# Altium footprint library 2.52-直插元件.PcbLib: 467 footprints (part 17 of 30)
Each footprint in its own frame and in the unit in brackets; x right, y up, seen from the top. Pads: shape width x height; smd on the part's side, far side on the other; paste and mask are expansions set on the pad; w line width, h text height; cw(c..) or ccw(c..) is an arc to the next point about the centre after c.
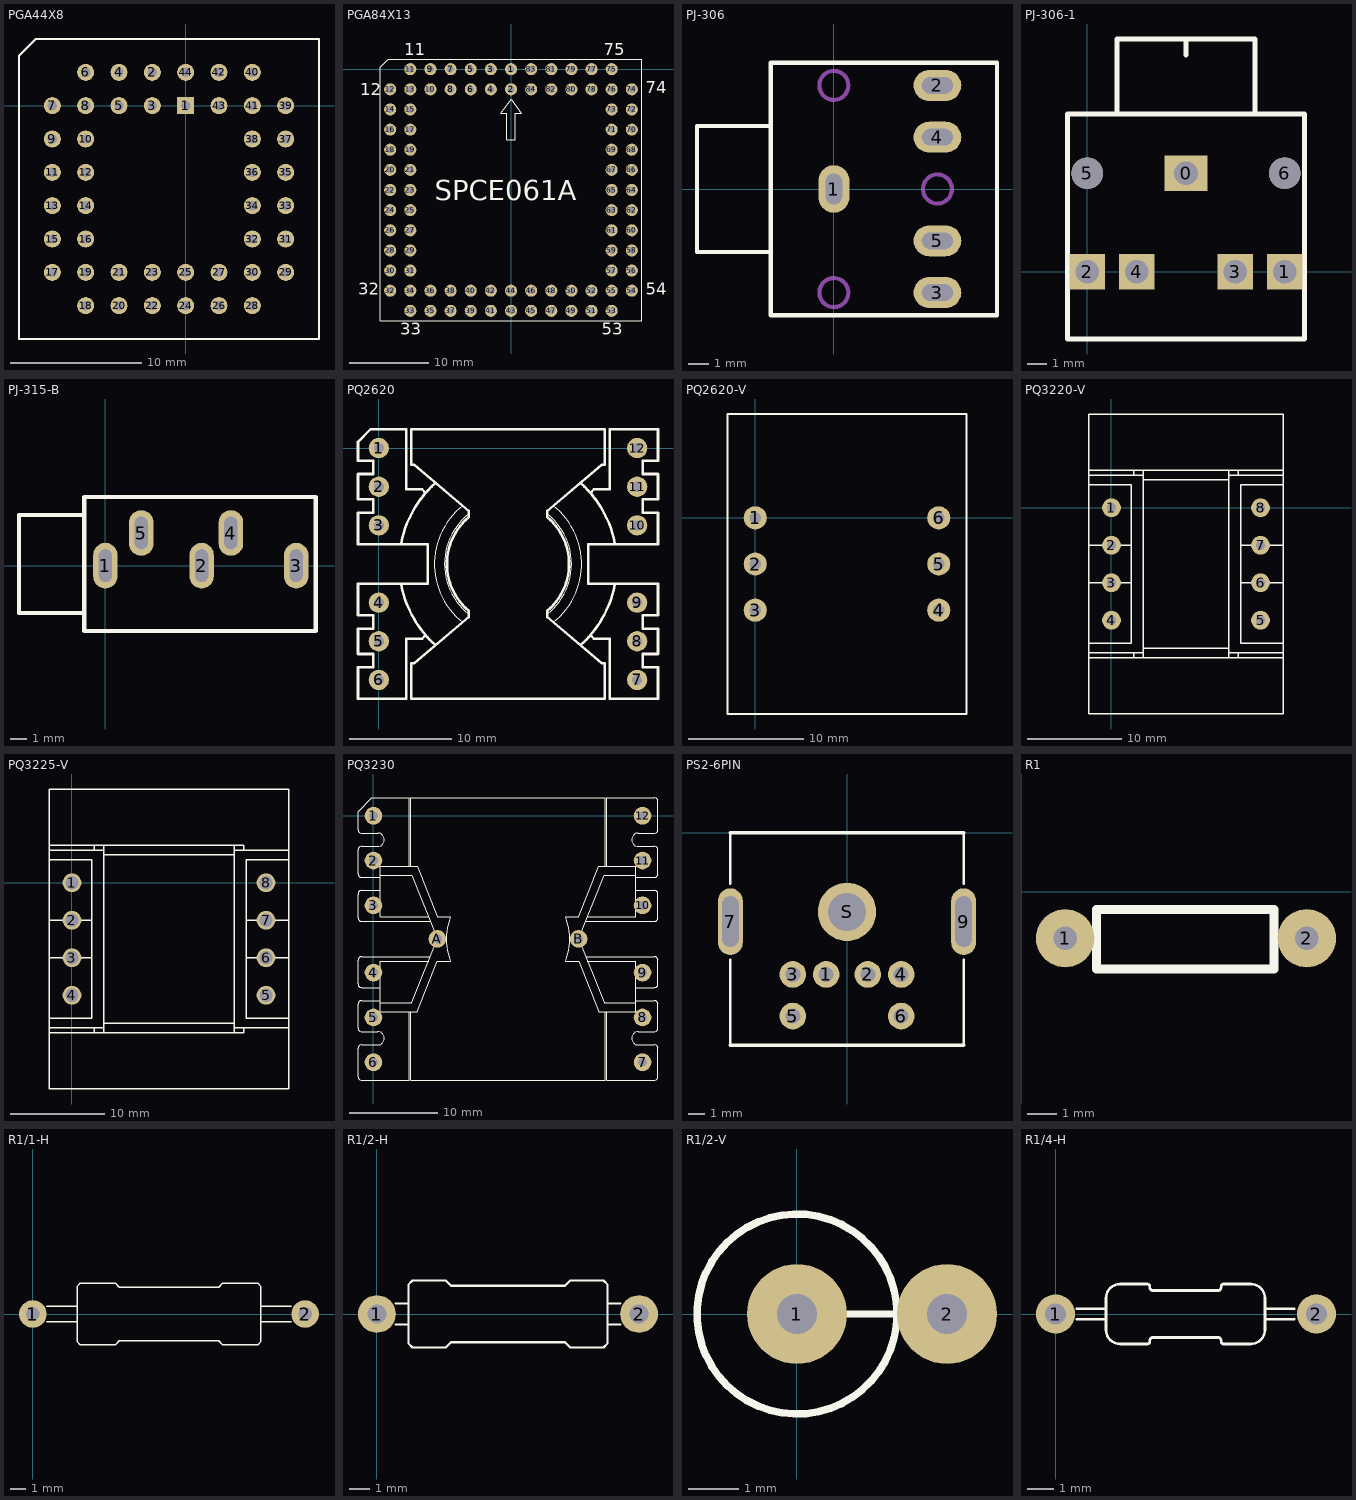
[diagram p16: the footprints below, top view; thin cyan lines are the x and y axes]

## PGA44X8 [mm]
pads (44):
  rect 1.3x1.3 hole 0.7: 1(0,0)
  round 1.3 hole 0.7: 2(-2.54,2.54) 3(-2.54,0) 4(-5.08,2.54) 5(-5.08,0) 6(-7.62,2.54) 7(-10.16,0) 8(-7.62,0) 9(-10.16,-2.54) 10(-7.62,-2.54) 11(-10.16,-5.08) 12(-7.62,-5.08) 13(-10.16,-7.62) 14(-7.62,-7.62) 15(-10.16,-10.16) 16(-7.62,-10.16) 17(-10.16,-12.7) 18(-7.62,-15.24) 19(-7.62,-12.7) 20(-5.08,-15.24) 21(-5.08,-12.7) 22(-2.54,-15.24) 23(-2.54,-12.7) 24(0,-15.24) 25(0,-12.7) 26(2.54,-15.24) 27(2.54,-12.7) 28(5.08,-15.24) 29(7.62,-12.7) 30(5.08,-12.7) 31(7.62,-10.16) 32(5.08,-10.16) 33(7.62,-7.62) 34(5.08,-7.62) 35(7.62,-5.08) 36(5.08,-5.08) 37(7.62,-2.54) 38(5.08,-2.54) 39(7.62,0) 40(5.08,2.54) 41(5.08,0) 42(2.54,2.54) 43(2.54,0) 44(0,2.54)
Top Overlay:
  lines w0.15: -12.7,-17.78 10.16,-17.78 10.16,5.08 -11.43,5.08 -12.7,3.81 -12.7,-17.78
3D body "User Library-PLCC44-1.STEP": height 8.16, standoff -3.3, extent -12.495,-17.575 9.955,4.875

## PGA84X13 [mil]
pads (84):
  round 60 hole 34: 1(0,0) 2(0,-100) 3(-100,0) 4(-100,-100) 5(-200,0) 6(-200,-100) 7(-300,0) 8(-300,-100) 9(-400,0) 10(-400,-100) 11(-500,0) 12(-600,-100) 13(-500,-100) 14(-600,-200) 15(-500,-200) 16(-600,-300) 17(-500,-300) 18(-600,-400) 19(-500,-400) 20(-600,-500) 21(-500,-500) 22(-600,-600) 23(-500,-600) 24(-600,-700) 25(-500,-700) 26(-600,-800) 27(-500,-800) 28(-600,-900) 29(-500,-900) 30(-600,-1000) 31(-500,-1000) 32(-600,-1100) 33(-500,-1200) 34(-500,-1100) 35(-400,-1200) 36(-400,-1100) 37(-300,-1200) 38(-300,-1100) 39(-200,-1200) 40(-200,-1100) 41(-100,-1200) 42(-100,-1100) 43(0,-1200) 44(0,-1100) 45(100,-1200) 46(100,-1100) 47(200,-1200) 48(200,-1100) 49(300,-1200) 50(300,-1100) 51(400,-1200) 52(400,-1100) 53(500,-1200) 54(600,-1100) 55(500,-1100) 56(600,-1000) 57(500,-1000) 58(600,-900) 59(500,-900) 60(600,-800) 61(500,-800) 62(600,-700) 63(500,-700) 64(600,-600) 65(500,-600) 66(600,-500) 67(500,-500) 68(600,-400) 69(500,-400) 70(600,-300) 71(500,-300) 72(600,-200) 73(500,-200) 74(600,-100) 75(500,0) 76(500,-100) 77(400,0) 78(400,-100) 79(300,0) 80(300,-100) 81(200,0) 82(200,-100) 83(100,0) 84(100,-100)
Top Overlay:
  lines w5.91: -650,-1250 650,-1250 650,50 -610,50 -650,10 -650,-1250 ; -50,-220 0,-150 50,-220 20,-220 20,-350 -20,-350 -20,-220 -50,-220
  text "SPCE061A" at -380,-650 h100
  text "53" at 450,-1320 h60
  text "33" at -550,-1320 h60
  text "75" at 460,70 h60
  text "11" at -530,70 h60
  text "32" at -760,-1120 h60
  text "12" at -750,-130 h60
  text "54" at 670,-1120 h60
  text "74" at 670,-120 h60
3D body "User Library-PLCC84 and SocketPLCC84.STEP": height 317.32, standoff -188.19, extent -691.93,-1291.93 691.93,91.93

## PJ-306 [mm] "立体声耳机插座"
pads (5):
  oval 1.5x2.3 hole 0.8 slot 1.5 at 90 deg: 1(0,0)
  oval 2.3x1.5 hole 0.8 slot 1.5 at 0 deg: 2(5,5) 3(5,-5) 4(5,2.5) 5(5,-2.5)
Top Overlay:
  lines w0.2: -3.048,-3.048 -6.604,-3.048 -6.604,3.048 -3.048,3.048 ; -3.048,-6.096 7.874,-6.096 7.874,6.096 -3.048,6.096 -3.048,0 -3.048,-6.096
Mechanical 1:
  circle w0.2: c0,-5 r0.7
  circle w0.2: c0,5 r0.7
  circle w0.2: c5,0 r0.7
3D body "耳机.STEP": height 3.2, standoff -10.8, extent -6.456,-6.05 8.644,6.05

## PJ-306-1 [mm]
pads (7):
  rect 2.2x1.8 hole 1.2: 0(5,5)
  rect 1.8x1.8 hole 1.2: 1(10,0) 2(0,0) 3(7.5,0) 4(2.5,0)
  round 1.6 hole 1.6 unplated: 5(0,5) 6(10,5)
Top Overlay:
  lines w0.254: 1.5,8 1.5,11.8 8.4,11.8 ; 5,11 5,11.8 ; 8.5,8 8.5,11.8 ; -1,-3.4 -1,8 11,8 11,-3.4 -1,-3.4
3D body "耳机.STEP": height 3.2, standoff -10.8, extent -1.041,-3.689 11.059,11.411

## PJ-315-B [mm] "立体声耳机插座"
pads (5):
  oval 1.5x2.8 hole 0.8 slot 2 at 90 deg: 1(0,0) 2(5.9,0) 3(11.7,0) 4(7.7,2) 5(2.2,2)
Top Overlay:
  lines w0.254: -1.3,-2.9 -5.3,-2.9 -5.3,3.1 -1.3,3.1 ; -1.3,-4 12.9,-4 12.9,4.2 -1.3,4.2 -1.3,-4

## PQ2620 [mm]
height 20.5
pads (12):
  round 2 hole 1: 1(0,0) 2(0,-3.8) 3(0,-7.6) 4(0,-15.2) 5(0,-19) 6(0,-22.8) 7(25.4,-22.8) 8(25.4,-19) 9(25.4,-15.2) 10(25.4,-7.6) 11(25.4,-3.8) 12(25.4,0)
Top Overlay:
  lines w0.1: 8.241,-17.117 cw(c12.7,-11.4) 8.249,-5.677 ; 8.838,-16.314 cw(c12.7,-11.4) 8.845,-6.48 ; 16.555,-6.48 cw(c12.7,-11.4) 16.562,-16.314 ; 17.151,-5.677 cw(c12.7,-11.4) 17.159,-17.117
  lines w0.254: 2.192,-13.418 ccw(c12.7,-11.4) 5.563,-19.372 ; 2.192,-9.382 cw(c12.7,-11.4) 5.578,-3.414 ; 4.609,-18.403 4.262,-18.75 2.7,-18.75 2.7,-24.65 -2.05,-24.65 -2.05,-21.55 -0.55,-21.55 -0.55,-20.25 -2.05,-20.25 -2.05,-17.75 -0.55,-17.75 -0.55,-16.45 -2.05,-16.45 -2.05,-13.35 4.8,-13.35 4.8,-9.45 -2.05,-9.45 -2.05,-6.35 -0.55,-6.35 -0.55,-5.05 -2.05,-5.05 -2.05,-2.55 -0.55,-2.55 -0.55,-1.25 -2.05,-1.25 -2.05,0.602 -0.802,1.85 2.7,1.85 2.7,-4.05 4.262,-4.05 4.609,-4.397 ; 8.843,-15.997 8.843,-16.617 3.5,-21.15 3.2,-21.15 3.2,-24.65 22.2,-24.65 22.2,-21.15 21.9,-21.15 16.556,-16.617 16.556,-15.997 ; 8.843,-15.996 cw(c12.7,-11.4) 8.843,-6.804 8.843,-6.183 ; 8.844,-6.183 3.5,-1.65 3.2,-1.65 3.2,1.85 22.2,1.85 22.2,-1.65 21.9,-1.65 16.557,-6.182 16.557,-6.803 cw(c12.7,-11.4) 16.557,-15.996 ; 19.822,-3.414 cw(c12.7,-11.4) 23.208,-9.382 ; 19.837,-19.372 ccw(c12.7,-11.4) 23.208,-13.418 ; 20.791,-18.403 21.138,-18.75 22.7,-18.75 22.7,-24.65 27.45,-24.65 27.45,-21.55 25.95,-21.55 25.95,-20.25 27.45,-20.25 27.45,-17.75 25.95,-17.75 25.95,-16.45 27.45,-16.45 27.45,-13.35 20.6,-13.35 20.6,-9.45 27.45,-9.45 27.45,-6.35 25.95,-6.35 25.95,-5.05 27.45,-5.05 27.45,-2.55 25.95,-2.55 25.95,-1.25 27.45,-1.25 27.45,1.85 22.7,1.85 22.7,-4.05 21.138,-4.05 20.791,-4.397
3D body "PQ-26.STEP": height 25.1, standoff -4.4, extent -1.6,-24.5 27,1.7

## PQ2620-V [mm]
height 20.5
pads (6):
  round 2 hole 1: 1(0,0) 2(0,-4) 3(0,-8) 4(15.9,-8) 5(15.9,-4) 6(15.9,0)
Top Overlay:
  lines w0.15: -2.4,-17 -2.4,9 18.3,9 18.3,-17 -2.4,-17
3D body "26-20(1).STEP": height 26.78, standoff -4, extent -2.45,-17 18.35,9

## PQ3220-V [mm]
height 20.5
pads (8):
  round 2 hole 1: 1(0,0) 2(0,-4) 3(0,-8) 4(0,-12) 5(15.9,-12) 6(15.9,-8) 7(15.9,-4) 8(15.9,0)
Top Overlay:
  lines w0.15: -2.4,-16 18.3,-16 ; -2.4,-14.45 2.1,-14.45 2.1,2.45 -2.4,2.45 ; -2.4,-8 2.102,-8 ; -2.4,-4 2.1,-4 ; -2.4,4 18.3,4 ; -2.397,-15.45 3.4,-15.45 ; -2.397,3.45 3.4,3.45 ; 2.4,-16 2.4,-15.45 ; 2.4,3.45 2.4,4 ; 3.4,-16 3.4,-15.45 ; 3.4,-15 12.5,-15 ; 3.4,3 12.5,3 ; 3.4,4 3.4,3.45 ; 12.5,-16 12.5,-15.45 ; 12.5,4 12.5,3.45 ; 13.5,-16 13.5,-15.45 ; 13.5,3.45 13.5,4 ; 13.798,-8 18.3,-8 ; 13.8,-4 18.3,-4 ; 18.297,-15.45 12.5,-15.45 ; 18.297,3.45 12.5,3.45 ; 18.3,-14.45 13.8,-14.45 13.8,2.45 18.3,2.45 ; 3.4,-15.45 3.4,3.45 ; 12.5,-15.45 12.5,3.45 ; -2.4,-22 18.3,-22 18.3,10 -2.4,10 -2.4,-22
3D body "PQ-32-2.STEP": height 29.65, standoff -3.97, extent -2.05,-21.85 17.95,9.85

## PQ3225-V [mm] "淘宝ID:黄晶宝石   店铺网址:https://shop463601444.taobao.com"
height 20.5
pads (8):
  round 2 hole 1.4: 1(0,0) 2(0,-4) 3(0,-8) 4(0,-12) 5(20.7,-12) 6(20.7,-8) 7(20.7,-4) 8(20.7,0)
Top Overlay:
  lines w0.15: -2.4,-16 18.3,-16 18.3,-15.45 ; -2.4,-14.45 2.1,-14.45 2.1,2.45 -2.4,2.45 ; -2.4,-8 2.102,-8 ; -2.4,-4 2.1,-4 ; -2.4,4 18.3,4 18.3,3.45 ; -2.397,-15.45 3.4,-15.45 ; -2.397,3.45 3.4,3.45 ; 2.4,-16 2.4,-15.45 ; 2.4,3.45 2.4,4 ; 3.4,-16 3.4,-15.45 ; 3.4,-15 17.295,-15 ; 3.4,3 17.298,3 ; 3.4,4 3.4,3.45 ; 17.3,-16 17.3,-15.45 ; 17.3,4 17.3,3.45 ; 18.598,-8 23.1,-8 ; 18.6,-4 23.1,-4 ; 23.097,-15.45 17.3,-15.45 ; 23.097,3.45 17.3,3.45 ; 23.1,-14.45 18.6,-14.45 18.6,2.45 23.1,2.45 ; 3.4,-15.45 3.4,3.45 ; 17.3,-15.45 17.3,3.45 ; -2.4,-22 23.1,-22 23.1,10 -2.4,10 -2.4,-22
3D body "PQ-32-2.STEP": height 29.8, standoff -3.82, extent -2.15,-21.85 22.85,9.85

## PQ3230 [mm]
height 20.5
pads (14):
  round 2 hole 1: 1(0,0) 2(0,-5.08) 3(0,-10.16) 4(0,-17.78) 5(0,-22.86) 6(0,-27.94) 7(30.5,-27.94) 8(30.5,-22.86) 9(30.5,-17.78) 10(30.5,-10.16) 11(30.5,-5.08) 12(30.5,0) A(7.25,-13.959) B(23.25,-13.959)
Top Overlay:
  lines w0.1: 4.05,-22.22 4.05,-29.97 -1.34,-29.97 cw(c-1.34,-29.56) -1.75,-29.56 -1.75,-26.38 cw(c-1.34,-26.38) -1.34,-25.97 0.5,-25.97 ccw(c0.5,-25.22) 0.5,-24.47 -1.34,-24.47 cw(c-1.34,-24.06) -1.75,-24.06 -1.75,-21.38 cw(c-1.34,-21.38) -1.34,-20.97 0.749,-20.97 0.749,-19.47 -1.34,-19.47 cw(c-1.34,-19.06) -1.75,-19.06 -1.75,-16.38 cw(c-1.34,-16.38) -1.34,-15.97 6.451,-15.97 ; 4.05,-5.72 4.05,2.03 -0.195,2.03 -1.75,0.475 -1.75,-1.56 ccw(c-1.34,-1.56) -1.34,-1.97 0.5,-1.97 cw(c0.5,-2.72) 0.5,-3.47 -1.34,-3.47 ccw(c-1.34,-3.88) -1.75,-3.88 -1.75,-6.56 ccw(c-1.34,-6.56) -1.34,-6.97 0.749,-6.97 0.749,-8.47 -1.34,-8.47 ccw(c-1.34,-8.88) -1.75,-8.88 -1.75,-11.56 ccw(c-1.34,-11.56) -1.34,-11.97 6.451,-11.97 ; 4.25,-22.22 4.25,-29.97 26.25,-29.97 26.25,-22.22 ; 4.25,-5.72 4.25,2.03 26.25,2.03 26.25,-5.72 ; 6.25,-16.47 0.75,-16.47 0.75,-21.22 ; 6.25,-11.47 0.75,-11.47 0.75,-6.72 ; 7.25,-13.981 4.341,-21.22 0.75,-21.22 ; 7.25,-13.959 4.341,-6.72 0.75,-6.72 ; 8.699,-16.47 7.25,-16.47 4.939,-22.22 0.75,-22.22 0.75,-21.22 ; 8.699,-11.47 7.25,-11.47 4.939,-5.72 0.75,-5.72 0.75,-6.72 ; 8.71,-16.466 cw(c15.25,-13.97) 8.71,-11.474 ; 21.79,-16.466 ccw(c15.25,-13.97) 21.79,-11.474 ; 21.801,-16.47 23.25,-16.47 25.561,-22.22 29.75,-22.22 29.75,-21.22 ; 21.801,-11.47 23.25,-11.47 25.561,-5.72 29.75,-5.72 29.75,-6.72 ; 23.25,-13.981 26.159,-21.22 29.75,-21.22 ; 23.25,-13.959 26.159,-6.72 29.75,-6.72 ; 24.049,-15.97 31.84,-15.97 cw(c31.84,-16.38) 32.25,-16.38 32.25,-19.06 cw(c31.84,-19.06) 31.84,-19.47 29.751,-19.47 29.751,-20.97 31.84,-20.97 cw(c31.84,-21.38) 32.25,-21.38 32.25,-24.06 cw(c31.84,-24.06) 31.84,-24.47 30,-24.47 ccw(c30,-25.22) 30,-25.97 31.84,-25.97 cw(c31.84,-26.38) 32.25,-26.38 32.25,-29.56 cw(c31.84,-29.56) 31.84,-29.97 26.45,-29.97 26.45,-22.22 ; 24.049,-11.97 31.84,-11.97 ccw(c31.84,-11.56) 32.25,-11.56 32.25,-8.88 ccw(c31.84,-8.88) 31.84,-8.47 29.751,-8.47 29.751,-6.97 31.84,-6.97 ccw(c31.84,-6.56) 32.25,-6.56 32.25,-3.88 ccw(c31.84,-3.88) 31.84,-3.47 30,-3.47 cw(c30,-2.72) 30,-1.97 31.84,-1.97 ccw(c31.84,-1.56) 32.25,-1.56 32.25,1.62 ccw(c31.84,1.62) 31.84,2.03 26.45,2.03 26.45,-5.72 ; 24.25,-16.47 29.75,-16.47 29.75,-21.22 ; 24.25,-11.47 29.75,-11.47 29.75,-6.72
3D body "PQ-32.STEP": height 30.1, standoff -4.8, extent -1.75,-29.97 32.25,2.03

## PS2-6PIN [mm]
pads (9):
  round 1.6 hole 0.9: 1(-1.25,-8.5) 2(1.25,-8.5) 3(-3.25,-8.5) 4(3.25,-8.5) 5(-3.25,-11) 6(3.25,-11)
  oval 1.5x4 hole 1 slot 3.048 at 90 deg: 7(-7,-5.334) 9(7,-5.334)
  round 3.5 hole 2.3: S(0,-4.75)
Top Overlay:
  lines w0.152: -7,-12.75 -7,-7.62 ; -7,-3.048 -7,0 ; 7,-12.75 7,-7.62 ; 7,-3.048 7,0
  lines w0.2: -7,-12.75 7,-12.75 ; -7,0 7,0

## R1 [mm]
pads (2):
  round 2 hole 0.813: 1(1.5,-1.6) 2(9.8,-1.6)
Top Overlay:
  lines w0.305: 1.56,-1.632 2.576,-1.632 ; 8.672,-1.632 9.688,-1.632 ; 2.576,-2.648 8.672,-2.648 8.672,-0.616 2.576,-0.616 2.576,-2.648

## R1/1-H [mm] "淘宝ID:黄晶宝石"
pads (2):
  round 1.8 hole 0.9: 1(0,0) 2(17.78,0)
Top Overlay:
  lines w0.1: 0.9,-0.5 2.89,-0.5 ; 0.9,0.5 2.89,0.5 ; 14.89,-0.5 16.88,-0.5 ; 14.89,0.5 16.88,0.5 ; 2.89,-1.802 2.89,1.802 3.088,2 5.39,2 5.64,1.75 7.518,1.75 12.14,1.75 12.39,2 14.692,2 14.89,1.802 14.89,-1.802 14.692,-2 12.39,-2 12.14,-1.75 5.64,-1.75 5.39,-2 3.088,-2 2.89,-1.802
3D body "User Library-Resistor 5-band.STEP": height 3.61, standoff -3.17, extent -0.012,-1.753 17.806,1.6

## R1/2-H [mm]
pads (2):
  round 1.8 hole 0.9: 1(0,0) 2(12.5,0)
Top Overlay:
  lines w0.1: 0.9,-0.5 1.5,-0.5 ; 0.9,0.5 1.5,0.5 ; 11,-0.5 11.6,-0.5 ; 11,0.5 11.6,0.5 ; 1.5,-1.4 1.698,-1.598 3.282,-1.598 3.532,-1.348 8.968,-1.348 9.218,-1.598 10.802,-1.598 11,-1.4 11,1.4 10.802,1.598 9.218,1.598 8.968,1.348 3.532,1.348 3.282,1.598 1.698,1.598 1.5,1.4 1.5,-1.4
3D body "User Library-Resistencia 0_5.step": height 3.6, standoff -1, extent -0.481,-1.429 12.981,1.429

## R1/2-V [mm]
pads (2):
  round 2 hole 0.8: 1(0,0) 2(3,0)
Top Overlay:
  circle w0.15: c0,0 r2
  lines w0.15: 0.754,0 2.219,0
3D body "User Library-Resistor 5-band.STEP": height 14.66, standoff -2, extent -1.874,-1.93 3.329,1.93

## R1/4-H [mm] "淘宝ID:黄晶宝石"
pads (2):
  round 1.5 hole 0.8: 1(0,0) 2(10,0)
Top Overlay:
  lines w0.1: 0.808,-0.2 1.932,-0.2 1.932,0.2 ; 0.808,0.2 1.932,0.2 ; 1.932,-0.2 1.932,-0.602 ccw(c2.48,-0.602) 2.48,-1.15 3.48,-1.15 3.508,-1.15 ccw(c3.508,-1.043) 3.615,-1.043 3.615,-1.015 cw(c3.73,-1.015) 3.73,-0.9 6.23,-0.9 cw(c6.23,-1.015) 6.345,-1.015 6.345,-1.043 ccw(c6.452,-1.043) 6.452,-1.15 6.48,-1.15 7.48,-1.15 ccw(c7.48,-0.602) 8.028,-0.602 8.028,-0.2 ; 8.028,0.2 9.152,0.2 ; 9.152,-0.2 8.028,-0.2 ; 1.932,0.2 1.932,0.602 cw(c2.48,0.602) 2.48,1.15 3.48,1.15 3.508,1.15 cw(c3.508,1.043) 3.615,1.043 3.615,1.015 ccw(c3.73,1.015) 3.73,0.9 6.23,0.9 ccw(c6.23,1.015) 6.345,1.015 6.345,1.043 cw(c6.452,1.043) 6.452,1.15 6.48,1.15 7.48,1.15 cw(c7.48,0.602) 8.028,0.602 8.028,0.2 8.028,-0.2
3D body "User Library-AXIAL_RESISTOR(0_25W).step": height 1.2, standoff -2.9, extent -0.4,-1.2 10.4,1.2